# Altium footprint library Connectors_Old.PcbLib: 246 footprints (part 16 of 18)
Each footprint in its own frame and in the unit in brackets; x right, y up, seen from the top. Pads: shape width x height; smd on the part's side, far side on the other; paste and mask are expansions set on the pad; w line width, h text height; cw(c..) or ccw(c..) is an arc to the next point about the centre after c.
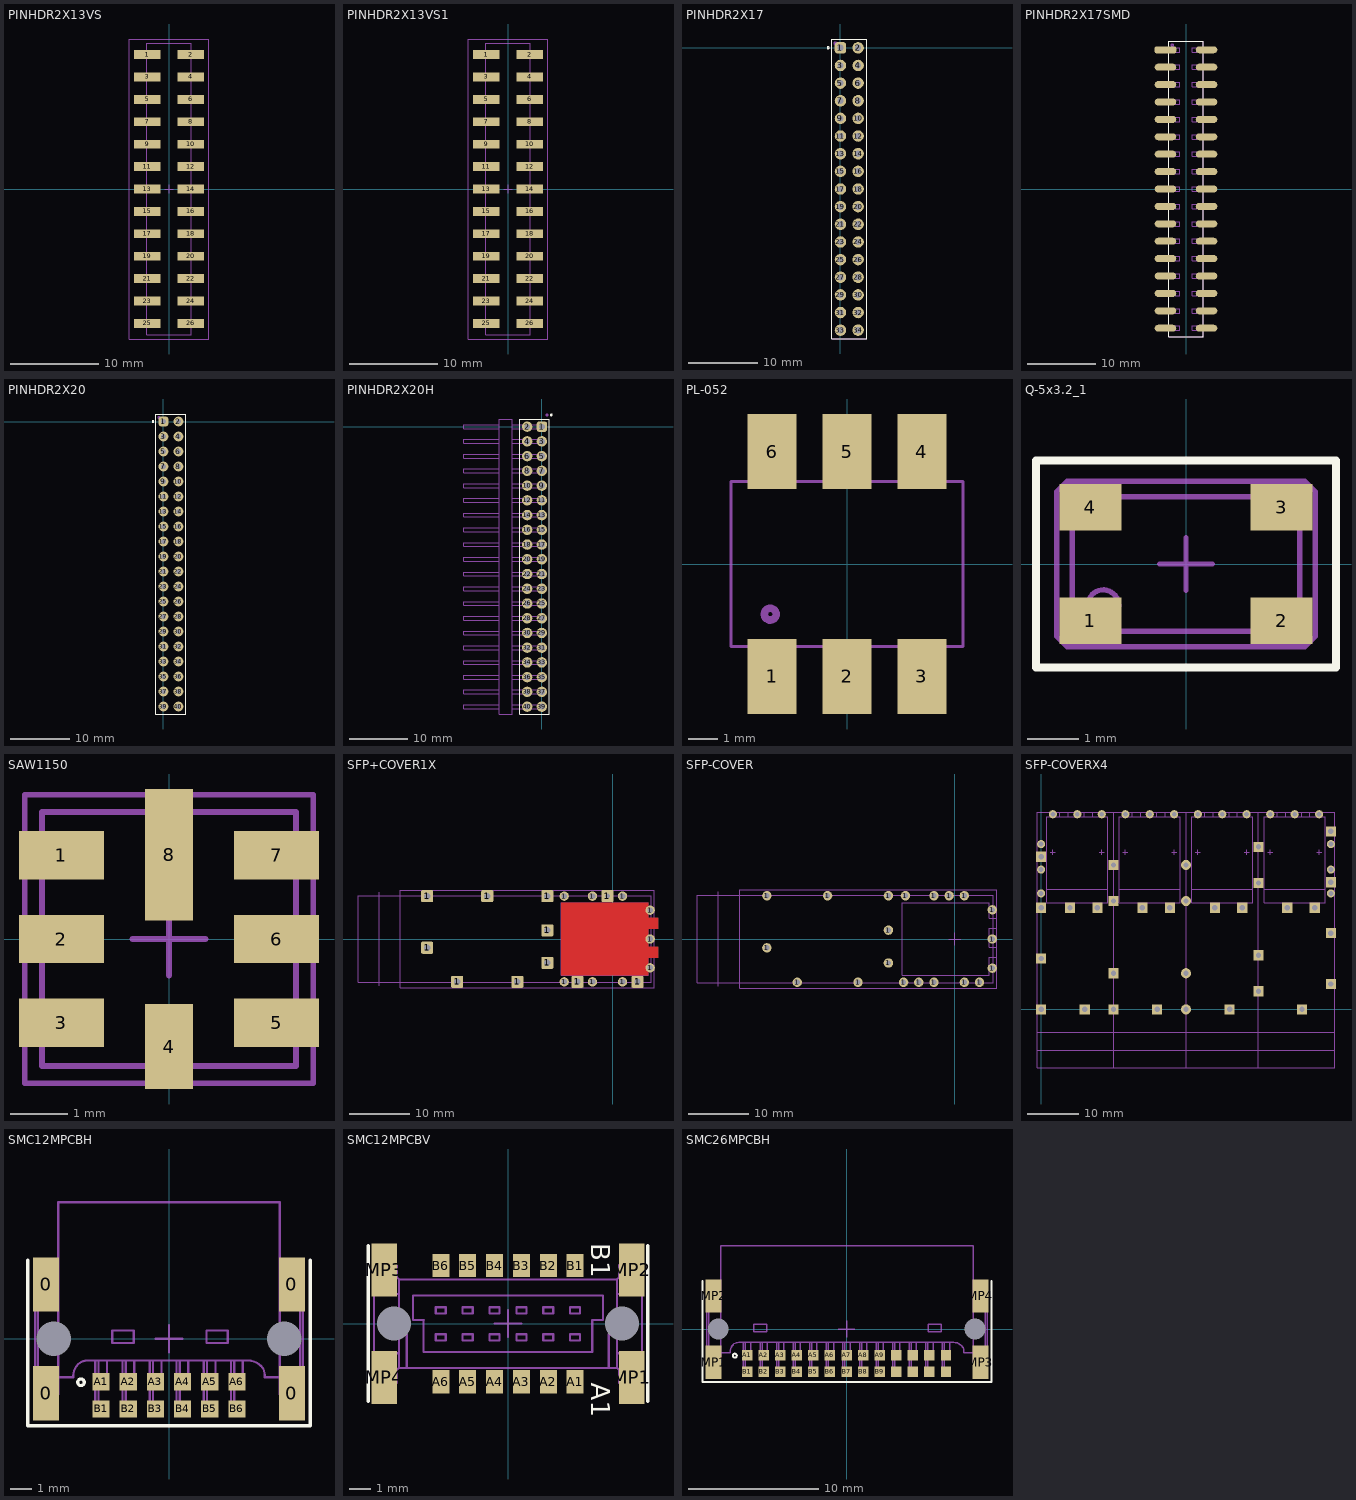
[diagram p15: the footprints below, top view; thin cyan lines are the x and y axes]

## PINHDR2X13VS [mm] "Pin header 2x13 pin R2.54mm"
height 11.04
pads (26):
  rect 3x1 smd: 1(-2.44,15.24) 2(2.44,15.24) 3(-2.44,12.7) 4(2.44,12.7) 5(-2.44,10.16) 6(2.44,10.16) 7(-2.44,7.62) 8(2.44,7.62) 9(-2.44,5.08) 10(2.44,5.08) 11(-2.44,2.54) 12(2.44,2.54) 13(-2.44,0) 14(2.44,0) 15(-2.44,-2.54) 16(2.44,-2.54) 17(-2.44,-5.08) 18(2.44,-5.08) 19(-2.44,-7.62) 20(2.44,-7.62) 21(-2.44,-10.16) 22(2.44,-10.16) 23(-2.44,-12.7) 24(2.44,-12.7) 25(-2.44,-15.24) 26(2.44,-15.24)
Mechanical 13:
  lines w0.102: -2.54,-16.51 2.54,-16.51 2.54,16.51 -2.54,16.51 -2.54,-16.51
  text "26" at 0.254,-15.85 h2.03
  text "25" at -2.134,-15.9 h2.03
  text "2" at 0.94,14.681 h2.03
  text "1" at -1.93,14.681 h2.03
Mechanical 15:
  lines w0.102: -0.5,0 0.5,0 ; 0,-0.5 0,0.5 ; -4.5,-17 -4.5,17 4.5,17 4.5,-17 -4.5,-17
3D body: height 11.04, standoff 0, extent 0.838,-15.646 1.651,-14.834
3D body: height 11.04, standoff 0, extent -1.651,-15.646 -0.838,-14.834
3D body: height 11.04, standoff 0, extent 0.838,-13.106 1.651,-12.294
3D body: height 11.04, standoff 0, extent -1.651,-13.106 -0.838,-12.294
3D body: height 11.04, standoff 0, extent 0.838,-10.566 1.651,-9.754
3D body: height 11.04, standoff 0, extent -1.651,-10.566 -0.838,-9.754
3D body: height 11.04, standoff 0, extent 0.838,-8.026 1.651,-7.214
3D body: height 11.04, standoff 0, extent -1.651,-8.026 -0.838,-7.214
3D body: height 11.04, standoff 0, extent 0.838,-5.486 1.651,-4.674
3D body: height 11.04, standoff 0, extent -1.651,-5.486 -0.838,-4.674
3D body: height 11.04, standoff 0, extent 0.838,-2.946 1.651,-2.134
3D body: height 11.04, standoff 0, extent -1.651,-2.946 -0.838,-2.134
3D body: height 11.04, standoff 0, extent 0.838,-0.406 1.651,0.406
3D body: height 11.04, standoff 0, extent -1.651,-0.406 -0.838,0.406
3D body: height 11.04, standoff 0, extent 0.838,2.134 1.651,2.946
3D body: height 11.04, standoff 0, extent -1.651,2.134 -0.838,2.946
3D body: height 11.04, standoff 0, extent 0.838,4.674 1.651,5.486
3D body: height 11.04, standoff 0, extent -1.651,4.674 -0.838,5.486
3D body: height 11.04, standoff 0, extent 0.838,7.214 1.651,8.026
3D body: height 11.04, standoff 0, extent -1.651,7.214 -0.838,8.026
3D body: height 11.04, standoff 0, extent 0.838,9.754 1.651,10.566
3D body: height 11.04, standoff 0, extent -1.651,9.754 -0.838,10.566
3D body: height 11.04, standoff 0, extent 0.838,12.294 1.651,13.106
3D body: height 11.04, standoff 0, extent -1.651,12.294 -0.838,13.106
3D body: height 11.04, standoff 0, extent 0.838,14.834 1.651,15.646
3D body: height 11.04, standoff 0, extent -1.651,14.834 -0.838,15.646
3D body: height 4.04, standoff 1.5, extent -2.54,-16.51 2.54,16.51
3D body: height 11.04, standoff 0, extent -1.651,14.834 -0.838,15.646
3D body: height 11.04, standoff 0, extent 0.838,14.834 1.651,15.646

## PINHDR2X13VS1 [mm] "Pin header 2x13 pin R2.54mm"
height 14.62
pads (26):
  rect 3x1 smd: 1(-2.44,15.24) 2(2.44,15.24) 3(-2.44,12.7) 4(2.44,12.7) 5(-2.44,10.16) 6(2.44,10.16) 7(-2.44,7.62) 8(2.44,7.62) 9(-2.44,5.08) 10(2.44,5.08) 11(-2.44,2.54) 12(2.44,2.54) 13(-2.44,0) 14(2.44,0) 15(-2.44,-2.54) 16(2.44,-2.54) 17(-2.44,-5.08) 18(2.44,-5.08) 19(-2.44,-7.62) 20(2.44,-7.62) 21(-2.44,-10.16) 22(2.44,-10.16) 23(-2.44,-12.7) 24(2.44,-12.7) 25(-2.44,-15.24) 26(2.44,-15.24)
Mechanical 13:
  lines w0.102: -2.54,-16.51 -2.54,16.51 2.54,16.51 2.54,-16.51 -2.54,-16.51
  text "1" at -1.93,14.681 h2.03
  text "2" at 0.94,14.681 h2.03
  text "25" at -2.134,-15.9 h2.03
  text "26" at 0.254,-15.85 h2.03
Mechanical 15:
  lines w0.102: -0.5,0 0.5,0 ; 0,-0.5 0,0.5 ; -4.5,-17 4.5,-17 4.5,17 -4.5,17 -4.5,-17
3D body: height 14.62, standoff 0, extent 0.838,14.834 1.651,15.646
3D body: height 14.62, standoff 0, extent -1.651,14.834 -0.838,15.646
3D body: height 4.04, standoff 1.5, extent -2.54,-16.51 2.54,16.51
3D body: height 14.62, standoff 0, extent -1.651,14.834 -0.838,15.646
3D body: height 14.62, standoff 0, extent 0.838,14.834 1.651,15.646
3D body: height 14.62, standoff 0, extent -1.651,12.294 -0.838,13.106
3D body: height 14.62, standoff 0, extent 0.838,12.294 1.651,13.106
3D body: height 14.62, standoff 0, extent -1.651,9.754 -0.838,10.566
3D body: height 14.62, standoff 0, extent 0.838,9.754 1.651,10.566
3D body: height 14.62, standoff 0, extent -1.651,7.214 -0.838,8.026
3D body: height 14.62, standoff 0, extent 0.838,7.214 1.651,8.026
3D body: height 14.62, standoff 0, extent -1.651,4.674 -0.838,5.486
3D body: height 14.62, standoff 0, extent 0.838,4.674 1.651,5.486
3D body: height 14.62, standoff 0, extent -1.651,2.134 -0.838,2.946
3D body: height 14.62, standoff 0, extent 0.838,2.134 1.651,2.946
3D body: height 14.62, standoff 0, extent -1.651,-0.406 -0.838,0.406
3D body: height 14.62, standoff 0, extent 0.838,-0.406 1.651,0.406
3D body: height 14.62, standoff 0, extent -1.651,-2.946 -0.838,-2.134
3D body: height 14.62, standoff 0, extent 0.838,-2.946 1.651,-2.134
3D body: height 14.62, standoff 0, extent -1.651,-5.486 -0.838,-4.674
3D body: height 14.62, standoff 0, extent 0.838,-5.486 1.651,-4.674
3D body: height 14.62, standoff 0, extent -1.651,-8.026 -0.838,-7.214
3D body: height 14.62, standoff 0, extent 0.838,-8.026 1.651,-7.214
3D body: height 14.62, standoff 0, extent -1.651,-10.566 -0.838,-9.754
3D body: height 14.62, standoff 0, extent 0.838,-10.566 1.651,-9.754
3D body: height 14.62, standoff 0, extent -1.651,-13.106 -0.838,-12.294
3D body: height 14.62, standoff 0, extent 0.838,-13.106 1.651,-12.294
3D body: height 14.62, standoff 0, extent -1.651,-15.646 -0.838,-14.834
3D body: height 14.62, standoff 0, extent 0.838,-15.646 1.651,-14.834

## PINHDR2X17 [mil] "Pin header 2x17 pin R2.54mm"
height 433.07
pads (34):
  rrect50% 65x65 hole 35.43 paste-50: 1(0,0)
  round 65 hole 35.43 paste-50: 2(100,0) 3(0,-100) 4(100,-100) 5(0,-200) 6(100,-200) 7(0,-300) 8(100,-300) 9(0,-400) 10(100,-400) 11(0,-500) 12(100,-500) 13(0,-600) 14(100,-600) 15(0,-700) 16(100,-700) 17(0,-800) 18(100,-800) 19(0,-900) 20(100,-900) 21(0,-1000) 22(100,-1000) 23(0,-1100) 24(100,-1100) 25(0,-1200) 26(100,-1200) 27(0,-1300) 28(100,-1300) 29(0,-1400) 30(100,-1400) 31(0,-1500) 32(100,-1500) 33(0,-1600) 34(100,-1600)
Top Overlay:
  circle w5.91: c-70,0 r6
  lines w5.91: -50,-1650 -50,50 150,50 150,-1650 -50,-1650
Mechanical 13:
  circle w10: c-29,26 r6
  lines w4: -50,-1650 -50,50 150,50 150,-1650 -50,-1650
3D body: height 314.96, standoff -125.98, extent -13,-13 13,13
3D body: height 314.96, standoff -125.98, extent 87,-13 113,13
3D body: height 100, standoff 0, extent -50,-1650 150,50
3D body: height 314.96, standoff -125.98, extent 87,-113 113,-87
3D body: height 314.96, standoff -125.98, extent -13,-113 13,-87
3D body: height 314.96, standoff -125.98, extent 87,-213 113,-187
3D body: height 314.96, standoff -125.98, extent -13,-213 13,-187
3D body: height 314.96, standoff -125.98, extent 87,-313 113,-287
3D body: height 314.96, standoff -125.98, extent -13,-313 13,-287
3D body: height 314.96, standoff -125.98, extent 87,-413 113,-387
3D body: height 314.96, standoff -125.98, extent -13,-413 13,-387
3D body: height 314.96, standoff -125.98, extent 87,-513 113,-487
3D body: height 314.96, standoff -125.98, extent -13,-513 13,-487
3D body: height 314.96, standoff -125.98, extent 87,-613 113,-587
3D body: height 314.96, standoff -125.98, extent -13,-613 13,-587
3D body: height 314.96, standoff -125.98, extent 87,-713 113,-687
3D body: height 314.96, standoff -125.98, extent -13,-713 13,-687
3D body: height 314.96, standoff -125.98, extent 87,-813 113,-787
3D body: height 314.96, standoff -125.98, extent -13,-813 13,-787
3D body: height 314.96, standoff -125.98, extent 87,-913 113,-887
3D body: height 314.96, standoff -125.98, extent -13,-913 13,-887
3D body: height 314.96, standoff -125.98, extent 87,-1013 113,-987
3D body: height 314.96, standoff -125.98, extent -13,-1013 13,-987
3D body: height 314.96, standoff -125.98, extent 87,-1113 113,-1087
3D body: height 314.96, standoff -125.98, extent -13,-1113 13,-1087
3D body: height 314.96, standoff -125.98, extent 87,-1213 113,-1187
3D body: height 314.96, standoff -125.98, extent -13,-1213 13,-1187
3D body: height 314.96, standoff -125.98, extent 87,-1313 113,-1287
3D body: height 314.96, standoff -125.98, extent -13,-1313 13,-1287
3D body: height 314.96, standoff -125.98, extent 87,-1413 113,-1387
3D body: height 314.96, standoff -125.98, extent -13,-1413 13,-1387
3D body: height 314.96, standoff -125.98, extent 87,-1513 113,-1487
3D body: height 314.96, standoff -125.98, extent -13,-1513 13,-1487
3D body: height 314.96, standoff -125.98, extent 87,-1613 113,-1587
3D body: height 314.96, standoff -125.98, extent -13,-1613 13,-1587

## PINHDR2X17SMD [mil] "Pin header 2x17 pin R2.54mm SMD"
height 433.07
pads (34):
  rrect50% 124x40 smd: 1(-118,800)
  oval 124x40 smd: 2(118,800) 3(-118,700) 4(118,700) 5(-118,600) 6(118,600) 7(-118,500) 8(118,500) 9(-118,400) 10(118,400) 11(-118,300) 12(118,300) 13(-118,200) 14(118,200) 15(-118,100) 16(118,100) 17(-118,0) 18(118,0) 19(-118,-100) 20(118,-100) 21(-118,-200) 22(118,-200) 23(-118,-300) 24(118,-300) 25(-118,-400) 26(118,-400) 27(-118,-500) 28(118,-500) 29(-118,-600) 30(118,-600) 31(-118,-700) 32(118,-700) 33(-118,-800) 34(118,-800)
Top Overlay:
  lines w5.91: -100,-850 100,-850 100,850 -100,850 -100,-850
Mechanical 13:
  circle w10: c-79,826 r6
  lines w3.94: -63,-813 -37,-813 -37,-787 -63,-787 -63,-813 ; -63,-713 -63,-687 -37,-687 -37,-713 -63,-713 ; -63,-613 -37,-613 -37,-587 -63,-587 -63,-613 ; -63,-513 -63,-487 -37,-487 -37,-513 -63,-513 ; -63,-413 -37,-413 -37,-387 -63,-387 -63,-413 ; -63,-313 -63,-287 -37,-287 -37,-313 -63,-313 ; -63,-213 -37,-213 -37,-187 -63,-187 -63,-213 ; -63,-113 -63,-87 -37,-87 -37,-113 -63,-113 ; -63,-13 -37,-13 -37,13 -63,13 -63,-13 ; -63,87 -63,113 -37,113 -37,87 -63,87 ; -63,187 -37,187 -37,213 -63,213 -63,187 ; -63,287 -63,313 -37,313 -37,287 -63,287 ; -63,387 -37,387 -37,413 -63,413 -63,387 ; -63,487 -63,513 -37,513 -37,487 -63,487 ; -63,587 -37,587 -37,613 -63,613 -63,587 ; -63,687 -37,687 -37,713 -63,713 -63,687 ; -63,787 -63,813 -37,813 -37,787 -63,787 ; 37,-813 37,-787 63,-787 63,-813 37,-813 ; 37,-713 63,-713 63,-687 37,-687 37,-713 ; 37,-613 37,-587 63,-587 63,-613 37,-613 ; 37,-513 63,-513 63,-487 37,-487 37,-513 ; 37,-413 37,-387 63,-387 63,-413 37,-413 ; 37,-313 63,-313 63,-287 37,-287 37,-313 ; 37,-213 37,-187 63,-187 63,-213 37,-213 ; 37,-113 63,-113 63,-87 37,-87 37,-113 ; 37,-13 37,13 63,13 63,-13 37,-13 ; 37,87 63,87 63,113 37,113 37,87 ; 37,187 37,213 63,213 63,187 37,187 ; 37,287 63,287 63,313 37,313 37,287 ; 37,387 37,413 63,413 63,387 37,387 ; 37,487 63,487 63,513 37,513 37,487 ; 37,587 37,613 63,613 63,587 37,587 ; 37,687 37,713 63,713 63,687 37,687 ; 37,787 63,787 63,813 37,813 37,787
  lines w4: -100,-850 100,-850 100,850 -100,850 -100,-850
3D body: height 100, standoff 0, extent -100,-850 100,850
3D body: height 393.7, standoff 0, extent -63,787 -37,813
3D body: height 393.7, standoff 0, extent 37,787 63,813
3D body: height 393.7, standoff 0, extent 37,687 63,713
3D body: height 393.7, standoff 0, extent -63,687 -37,713
3D body: height 393.7, standoff 0, extent -63,487 -37,513
3D body: height 393.7, standoff 0, extent 37,487 63,513
3D body: height 393.7, standoff 0, extent 37,587 63,613
3D body: height 393.7, standoff 0, extent -63,587 -37,613
3D body: height 393.7, standoff 0, extent -63,287 -37,313
3D body: height 393.7, standoff 0, extent 37,287 63,313
3D body: height 393.7, standoff 0, extent 37,387 63,413
3D body: height 393.7, standoff 0, extent -63,387 -37,413
3D body: height 393.7, standoff 0, extent -63,87 -37,113
3D body: height 393.7, standoff 0, extent 37,87 63,113
3D body: height 393.7, standoff 0, extent 37,187 63,213
3D body: height 393.7, standoff 0, extent -63,187 -37,213
3D body: height 393.7, standoff 0, extent -63,-113 -37,-87
3D body: height 393.7, standoff 0, extent 37,-113 63,-87
3D body: height 393.7, standoff 0, extent 37,-13 63,13
3D body: height 393.7, standoff 0, extent -63,-13 -37,13
3D body: height 393.7, standoff 0, extent -63,-313 -37,-287
3D body: height 393.7, standoff 0, extent 37,-313 63,-287
3D body: height 393.7, standoff 0, extent 37,-213 63,-187
3D body: height 393.7, standoff 0, extent -63,-213 -37,-187
3D body: height 393.7, standoff 0, extent -63,-513 -37,-487
3D body: height 393.7, standoff 0, extent 37,-513 63,-487
3D body: height 393.7, standoff 0, extent 37,-413 63,-387
3D body: height 393.7, standoff 0, extent -63,-413 -37,-387
3D body: height 393.7, standoff 0, extent -63,-713 -37,-687
3D body: height 393.7, standoff 0, extent 37,-713 63,-687
3D body: height 393.7, standoff 0, extent 37,-613 63,-587
3D body: height 393.7, standoff 0, extent -63,-613 -37,-587
3D body: height 393.7, standoff 0, extent 37,-813 63,-787
3D body: height 393.7, standoff 0, extent -63,-813 -37,-787

## PINHDR2X20 [mil] "Pin header 2x20 pin R2.54mm"
height 433.07
pads (40):
  rrect50% 65x65 hole 35.43 paste-50: 1(0,0)
  round 65 hole 35.43 paste-50: 2(100,0) 3(0,-100) 4(100,-100) 5(0,-200) 6(100,-200) 7(0,-300) 8(100,-300) 9(0,-400) 10(100,-400) 11(0,-500) 12(100,-500) 13(0,-600) 14(100,-600) 15(0,-700) 16(100,-700) 17(0,-800) 18(100,-800) 19(0,-900) 20(100,-900) 21(0,-1000) 22(100,-1000) 23(0,-1100) 24(100,-1100) 25(0,-1200) 26(100,-1200) 27(0,-1300) 28(100,-1300) 29(0,-1400) 30(100,-1400) 31(0,-1500) 32(100,-1500) 33(0,-1600) 34(100,-1600) 35(0,-1700) 36(100,-1700) 37(0,-1800) 38(100,-1800) 39(0,-1900) 40(100,-1900)
Top Overlay:
  circle w5.91: c-70,0 r6
  lines w5.91: -50,-1950 150,-1950 150,50 -50,50 -50,-1950
Mechanical 13:
  drawing of 165 lines, arcs and shapes, not listed
3D body: height 314.96, standoff -125.98, extent 87,-1913 113,-1887
3D body: height 314.96, standoff -125.98, extent -13,-1913 13,-1887
3D body: height 314.96, standoff -125.98, extent -13,-1813 13,-1787
3D body: height 314.96, standoff -125.98, extent 87,-1813 113,-1787
3D body: height 314.96, standoff -125.98, extent -13,-1713 13,-1687
3D body: height 314.96, standoff -125.98, extent 87,-1713 113,-1687
3D body: height 314.96, standoff -125.98, extent -13,-1613 13,-1587
3D body: height 314.96, standoff -125.98, extent 87,-1613 113,-1587
3D body: height 314.96, standoff -125.98, extent -13,-1513 13,-1487
3D body: height 314.96, standoff -125.98, extent 87,-1513 113,-1487
3D body: height 314.96, standoff -125.98, extent -13,-1413 13,-1387
3D body: height 314.96, standoff -125.98, extent 87,-1413 113,-1387
3D body: height 314.96, standoff -125.98, extent -13,-1313 13,-1287
3D body: height 314.96, standoff -125.98, extent 87,-1313 113,-1287
3D body: height 314.96, standoff -125.98, extent -13,-1213 13,-1187
3D body: height 314.96, standoff -125.98, extent 87,-1213 113,-1187
3D body: height 314.96, standoff -125.98, extent -13,-1113 13,-1087
3D body: height 314.96, standoff -125.98, extent 87,-1113 113,-1087
3D body: height 314.96, standoff -125.98, extent -13,-1013 13,-987
3D body: height 314.96, standoff -125.98, extent 87,-1013 113,-987
3D body: height 314.96, standoff -125.98, extent -13,-913 13,-887
3D body: height 314.96, standoff -125.98, extent 87,-913 113,-887
3D body: height 314.96, standoff -125.98, extent -13,-813 13,-787
3D body: height 314.96, standoff -125.98, extent 87,-813 113,-787
3D body: height 314.96, standoff -125.98, extent -13,-713 13,-687
3D body: height 314.96, standoff -125.98, extent 87,-713 113,-687
3D body: height 314.96, standoff -125.98, extent -13,-613 13,-587
3D body: height 314.96, standoff -125.98, extent 87,-613 113,-587
3D body: height 314.96, standoff -125.98, extent -13,-513 13,-487
3D body: height 314.96, standoff -125.98, extent 87,-513 113,-487
3D body: height 314.96, standoff -125.98, extent -13,-413 13,-387
3D body: height 314.96, standoff -125.98, extent 87,-413 113,-387
3D body: height 314.96, standoff -125.98, extent -13,-313 13,-287
3D body: height 314.96, standoff -125.98, extent 87,-313 113,-287
3D body: height 314.96, standoff -125.98, extent -13,-213 13,-187
3D body: height 314.96, standoff -125.98, extent 87,-213 113,-187
3D body: height 314.96, standoff -125.98, extent -13,-113 13,-87
3D body: height 314.96, standoff -125.98, extent 87,-113 113,-87
3D body: height 100, standoff 0, extent -50,-1950 150,50
3D body: height 314.96, standoff -125.98, extent 87,-13 113,13
3D body: height 314.96, standoff -125.98, extent -13,-13 13,13

## PINHDR2X20H [mm] "Pin header 2x20 pin R2.54mm Horizontal"
height 8.16
pads (40):
  rrect50% 1.8x1.8 hole 1 paste-1.27: 1(0,0)
  round 1.8 hole 1 paste-1.27: 2(-2.54,0) 3(0,-2.54) 4(-2.54,-2.54) 5(0,-5.08) 6(-2.54,-5.08) 7(0,-7.62) 8(-2.54,-7.62) 9(0,-10.16) 10(-2.54,-10.16) 11(0,-12.7) 12(-2.54,-12.7) 13(0,-15.24) 14(-2.54,-15.24) 15(0,-17.78) 16(-2.54,-17.78) 17(0,-20.32) 18(-2.54,-20.32) 19(0,-22.86) 20(-2.54,-22.86) 21(0,-25.4) 22(-2.54,-25.4) 23(0,-27.94) 24(-2.54,-27.94) 25(0,-30.48) 26(-2.54,-30.48) 27(0,-33.02) 28(-2.54,-33.02) 29(0,-35.56) 30(-2.54,-35.56) 31(0,-38.1) 32(-2.54,-38.1) 33(0,-40.64) 34(-2.54,-40.64) 35(0,-43.18) 36(-2.54,-43.18) 37(0,-45.72) 38(-2.54,-45.72) 39(0,-48.26) 40(-2.54,-48.26)
Top Overlay:
  circle w0.15: c1.626,2.032 r0.152
  lines w0.15: -3.81,-49.53 1.27,-49.53 1.27,1.27 -3.81,1.27 -3.81,-49.53
Mechanical 13:
  circle w0.254: c0.864,2.032 r0.152
  lines w0.1: -7.37,-48.59 -13.462,-48.59 -13.462,-47.93 -7.37,-47.93 ; -7.37,-46.05 -13.462,-46.05 -13.462,-45.39 -7.37,-45.39 ; -7.37,-43.51 -13.462,-43.51 -13.462,-42.85 -7.37,-42.85 ; -7.37,-40.97 -13.462,-40.97 -13.462,-40.31 -7.37,-40.31 ; -7.37,-38.43 -13.462,-38.43 -13.462,-37.77 -7.37,-37.77 ; -7.37,-35.89 -13.462,-35.89 -13.462,-35.23 -7.37,-35.23 ; -7.37,-33.35 -13.462,-33.35 -13.462,-32.69 -7.37,-32.69 ; -7.37,-30.81 -13.462,-30.81 -13.462,-30.15 -7.37,-30.15 ; -7.37,-28.27 -13.462,-28.27 -13.462,-27.61 -7.37,-27.61 ; -7.37,-25.73 -13.462,-25.73 -13.462,-25.07 -7.37,-25.07 ; -7.37,-23.19 -13.462,-23.19 -13.462,-22.53 -7.37,-22.53 ; -7.37,-20.65 -13.462,-20.65 -13.462,-19.99 -7.37,-19.99 ; -7.37,-18.11 -13.462,-18.11 -13.462,-17.45 -7.37,-17.45 ; -7.37,-15.57 -13.462,-15.57 -13.462,-14.91 -7.37,-14.91 ; -7.37,-13.03 -13.462,-13.03 -13.462,-12.37 -7.37,-12.37 ; -7.37,-10.49 -13.462,-10.49 -13.462,-9.83 -7.37,-9.83 ; -7.37,-7.95 -13.462,-7.95 -13.462,-7.29 -7.37,-7.29 ; -7.37,-5.41 -13.462,-5.41 -13.462,-4.75 -7.37,-4.75 ; -7.37,-2.87 -13.462,-2.87 -13.462,-2.21 -7.37,-2.21 ; -7.37,-0.33 -13.462,-0.33 -13.462,0.33 -7.37,0.33 ; -5.08,-48.59 0.33,-48.59 0.33,-47.93 -5.08,-47.93 ; -5.08,-46.05 0.33,-46.05 0.33,-45.39 -5.08,-45.39 ; -5.08,-43.51 0.33,-43.51 0.33,-42.85 -5.08,-42.85 ; -5.08,-40.97 0.33,-40.97 0.33,-40.31 -5.08,-40.31 ; -5.08,-38.43 0.33,-38.43 0.33,-37.77 -5.08,-37.77 ; -5.08,-35.89 0.33,-35.89 0.33,-35.23 -5.08,-35.23 ; -5.08,-33.35 0.33,-33.35 0.33,-32.69 -5.08,-32.69 ; -5.08,-30.81 0.33,-30.81 0.33,-30.15 -5.08,-30.15 ; -5.08,-28.27 0.33,-28.27 0.33,-27.61 -5.08,-27.61 ; -5.08,-25.73 0.33,-25.73 0.33,-25.07 -5.08,-25.07 ; -5.08,-23.19 0.33,-23.19 0.33,-22.53 -5.08,-22.53 ; -5.08,-20.65 0.33,-20.65 0.33,-19.99 -5.08,-19.99 ; -5.08,-18.11 0.33,-18.11 0.33,-17.45 -5.08,-17.45 ; -5.08,-15.57 0.33,-15.57 0.33,-14.91 -5.08,-14.91 ; -5.08,-13.03 0.33,-13.03 0.33,-12.37 -5.08,-12.37 ; -5.08,-10.49 0.33,-10.49 0.33,-9.83 -5.08,-9.83 ; -5.08,-7.95 0.33,-7.95 0.33,-7.29 -5.08,-7.29 ; -5.08,-5.41 0.33,-5.41 0.33,-4.75 -5.08,-4.75 ; -5.08,-2.87 0.33,-2.87 0.33,-2.21 -5.08,-2.21 ; -5.08,-0.33 0.33,-0.33 0.33,0.33 -5.08,0.33
  lines w0.102: -7.37,-49.53 -7.37,1.27 -5.08,1.27 -5.08,-49.53 -7.37,-49.53
3D body: height 3.75, standoff 0, extent -0.33,-0.33 0.33,0.33
3D body: height 3.75, standoff 0, extent -0.33,-2.87 0.33,-2.21
3D body: height 3.75, standoff 0, extent -0.33,-5.41 0.33,-4.75
3D body: height 3.75, standoff 0, extent -0.33,-7.95 0.33,-7.29
3D body: height 3.75, standoff 0, extent -0.33,-10.49 0.33,-9.83
3D body: height 3.75, standoff 0, extent -0.33,-13.03 0.33,-12.37
3D body: height 3.75, standoff 0, extent -0.33,-15.57 0.33,-14.91
3D body: height 3.75, standoff 0, extent -0.33,-18.11 0.33,-17.45
3D body: height 3.75, standoff 0, extent -0.33,-20.65 0.33,-19.99
3D body: height 3.75, standoff 0, extent -0.33,-23.19 0.33,-22.53
3D body: height 3.75, standoff 0, extent -0.33,-25.73 0.33,-25.07
3D body: height 3.75, standoff 0, extent -0.33,-28.27 0.33,-27.61
3D body: height 3.75, standoff 0, extent -0.33,-30.81 0.33,-30.15
3D body: height 3.75, standoff 0, extent -0.33,-33.35 0.33,-32.69
3D body: height 3.75, standoff 0, extent -0.33,-35.89 0.33,-35.23
3D body: height 3.75, standoff 0, extent -0.33,-38.43 0.33,-37.77
3D body: height 3.75, standoff 0, extent -0.33,-40.97 0.33,-40.31
3D body: height 3.75, standoff 0, extent -0.33,-43.51 0.33,-42.85
3D body: height 3.75, standoff 0, extent -0.33,-46.05 0.33,-45.39
3D body: height 3.75, standoff 0, extent -0.33,-48.59 0.33,-47.93
3D body: height 1.25, standoff 0, extent -2.87,-0.33 -2.21,0.33
3D body: height 1.25, standoff 0, extent -2.87,-2.87 -2.21,-2.21
3D body: height 1.25, standoff 0, extent -2.87,-5.41 -2.21,-4.75
3D body: height 1.25, standoff 0, extent -2.87,-7.95 -2.21,-7.29
3D body: height 1.25, standoff 0, extent -2.87,-10.49 -2.21,-9.83
3D body: height 1.25, standoff 0, extent -2.87,-13.03 -2.21,-12.37
3D body: height 1.25, standoff 0, extent -2.87,-15.57 -2.21,-14.91
3D body: height 1.25, standoff 0, extent -2.87,-18.11 -2.21,-17.45
3D body: height 1.25, standoff 0, extent -2.87,-20.65 -2.21,-19.99
3D body: height 1.25, standoff 0, extent -2.87,-23.19 -2.21,-22.53
3D body: height 1.25, standoff 0, extent -2.87,-25.73 -2.21,-25.07
3D body: height 1.25, standoff 0, extent -2.87,-28.27 -2.21,-27.61
3D body: height 1.25, standoff 0, extent -2.87,-30.81 -2.21,-30.15
3D body: height 1.25, standoff 0, extent -2.87,-33.35 -2.21,-32.69
3D body: height 1.25, standoff 0, extent -2.87,-35.89 -2.21,-35.23
3D body: height 1.25, standoff 0, extent -2.87,-38.43 -2.21,-37.77
3D body: height 1.25, standoff 0, extent -2.87,-40.97 -2.21,-40.31
3D body: height 1.25, standoff 0, extent -2.87,-43.51 -2.21,-42.85
3D body: height 1.25, standoff 0, extent -2.87,-46.05 -2.21,-45.39
3D body: height 1.25, standoff 0, extent -2.87,-48.59 -2.21,-47.93
3D body: height 5, standoff 0, extent -7.37,-49.53 -5.08,1.27
3D body: height 1.9, standoff 1.25, extent -5.08,-48.59 -2.21,-47.93
3D body: height 1.9, standoff 1.25, extent -5.08,-46.05 -2.21,-45.39
3D body: height 1.9, standoff 1.25, extent -5.08,-43.51 -2.21,-42.85
3D body: height 1.9, standoff 1.25, extent -5.08,-40.97 -2.21,-40.31
3D body: height 1.9, standoff 1.25, extent -5.08,-38.43 -2.21,-37.77
3D body: height 1.9, standoff 1.25, extent -5.08,-35.89 -2.21,-35.23
3D body: height 1.9, standoff 1.25, extent -5.08,-33.35 -2.21,-32.69
3D body: height 1.9, standoff 1.25, extent -5.08,-30.81 -2.21,-30.15
3D body: height 1.9, standoff 1.25, extent -5.08,-28.27 -2.21,-27.61
3D body: height 1.9, standoff 1.25, extent -5.08,-25.73 -2.21,-25.07
3D body: height 1.9, standoff 1.25, extent -5.08,-23.19 -2.21,-22.53
3D body: height 1.9, standoff 1.25, extent -5.08,-20.65 -2.21,-19.99
3D body: height 1.9, standoff 1.25, extent -5.08,-18.11 -2.21,-17.45
3D body: height 1.9, standoff 1.25, extent -5.08,-15.57 -2.21,-14.91
3D body: height 1.9, standoff 1.25, extent -5.08,-13.03 -2.21,-12.37
3D body: height 1.9, standoff 1.25, extent -5.08,-10.49 -2.21,-9.83
3D body: height 1.9, standoff 1.25, extent -5.08,-7.95 -2.21,-7.29
3D body: height 1.9, standoff 1.25, extent -5.08,-5.41 -2.21,-4.75
3D body: height 1.9, standoff 1.25, extent -5.08,-2.87 -2.21,-2.21
3D body: height 1.9, standoff 1.25, extent -5.08,-0.33 -2.21,0.33
3D body: height 4.43, standoff 3.75, extent -5.08,-48.59 0.33,-47.93
3D body: height 4.43, standoff 3.75, extent -5.08,-46.05 0.33,-45.39
3D body: height 4.43, standoff 3.75, extent -5.08,-43.51 0.33,-42.85
3D body: height 4.43, standoff 3.75, extent -5.08,-40.97 0.33,-40.31
3D body: height 4.43, standoff 3.75, extent -5.08,-38.43 0.33,-37.77
3D body: height 4.43, standoff 3.75, extent -5.08,-35.89 0.33,-35.23
3D body: height 4.43, standoff 3.75, extent -5.08,-33.35 0.33,-32.69
3D body: height 4.43, standoff 3.75, extent -5.08,-30.81 0.33,-30.15
3D body: height 4.43, standoff 3.75, extent -5.08,-28.27 0.33,-27.61
3D body: height 4.43, standoff 3.75, extent -5.08,-25.73 0.33,-25.07
3D body: height 4.43, standoff 3.75, extent -5.08,-23.19 0.33,-22.53
3D body: height 4.43, standoff 3.75, extent -5.08,-20.65 0.33,-19.99
3D body: height 4.43, standoff 3.75, extent -5.08,-18.11 0.33,-17.45
3D body: height 4.43, standoff 3.75, extent -5.08,-15.57 0.33,-14.91
3D body: height 4.43, standoff 3.75, extent -5.08,-13.03 0.33,-12.37
3D body: height 4.43, standoff 3.75, extent -5.08,-10.49 0.33,-9.83
3D body: height 4.43, standoff 3.75, extent -5.08,-7.95 0.33,-7.29
3D body: height 4.43, standoff 3.75, extent -5.08,-5.41 0.33,-4.75
3D body: height 4.43, standoff 3.75, extent -5.08,-2.87 0.33,-2.21
3D body: height 4.43, standoff 3.75, extent -5.08,-0.33 0.33,0.33
3D body: height 4.43, standoff 3.75, extent -13.462,-48.59 -7.37,-47.93
3D body: height 4.43, standoff 3.75, extent -13.462,-46.05 -7.37,-45.39
3D body: height 4.43, standoff 3.75, extent -13.462,-43.51 -7.37,-42.85
3D body: height 4.43, standoff 3.75, extent -13.462,-40.97 -7.37,-40.31
3D body: height 4.43, standoff 3.75, extent -13.462,-38.43 -7.37,-37.77
3D body: height 4.43, standoff 3.75, extent -13.462,-35.89 -7.37,-35.23
3D body: height 4.43, standoff 3.75, extent -13.462,-33.35 -7.37,-32.69
3D body: height 4.43, standoff 3.75, extent -13.462,-30.81 -7.37,-30.15
3D body: height 4.43, standoff 3.75, extent -13.462,-28.27 -7.37,-27.61
3D body: height 4.43, standoff 3.75, extent -13.462,-25.73 -7.37,-25.07
3D body: height 4.43, standoff 3.75, extent -13.462,-23.19 -7.37,-22.53
3D body: height 4.43, standoff 3.75, extent -13.462,-20.65 -7.37,-19.99
3D body: height 4.43, standoff 3.75, extent -13.462,-18.11 -7.37,-17.45
3D body: height 4.43, standoff 3.75, extent -13.462,-15.57 -7.37,-14.91
3D body: height 4.43, standoff 3.75, extent -13.462,-13.03 -7.37,-12.37
3D body: height 4.43, standoff 3.75, extent -13.462,-10.49 -7.37,-9.83
3D body: height 4.43, standoff 3.75, extent -13.462,-7.95 -7.37,-7.29
3D body: height 4.43, standoff 3.75, extent -13.462,-5.41 -7.37,-4.75
3D body: height 4.43, standoff 3.75, extent -13.462,-2.87 -7.37,-2.21
3D body: height 4.43, standoff 3.75, extent -13.462,-0.33 -7.37,0.33
3D body: height 1.9, standoff 1.25, extent -13.462,-48.59 -7.37,-47.93
3D body: height 1.9, standoff 1.25, extent -13.462,-46.05 -7.37,-45.39
3D body: height 1.9, standoff 1.25, extent -13.462,-43.51 -7.37,-42.85
3D body: height 1.9, standoff 1.25, extent -13.462,-40.97 -7.37,-40.31
3D body: height 1.9, standoff 1.25, extent -13.462,-38.43 -7.37,-37.77
3D body: height 1.9, standoff 1.25, extent -13.462,-35.89 -7.37,-35.23
3D body: height 1.9, standoff 1.25, extent -13.462,-33.35 -7.37,-32.69
3D body: height 1.9, standoff 1.25, extent -13.462,-30.81 -7.37,-30.15
3D body: height 1.9, standoff 1.25, extent -13.462,-28.27 -7.37,-27.61
3D body: height 1.9, standoff 1.25, extent -13.462,-25.73 -7.37,-25.07
3D body: height 1.9, standoff 1.25, extent -13.462,-23.19 -7.37,-22.53
3D body: height 1.9, standoff 1.25, extent -13.462,-20.65 -7.37,-19.99
3D body: height 1.9, standoff 1.25, extent -13.462,-18.11 -7.37,-17.45
3D body: height 1.9, standoff 1.25, extent -13.462,-15.57 -7.37,-14.91
3D body: height 1.9, standoff 1.25, extent -13.462,-13.03 -7.37,-12.37
3D body: height 1.9, standoff 1.25, extent -13.462,-10.49 -7.37,-9.83
3D body: height 1.9, standoff 1.25, extent -13.462,-7.95 -7.37,-7.29
3D body: height 1.9, standoff 1.25, extent -13.462,-5.41 -7.37,-4.75
3D body: height 1.9, standoff 1.25, extent -13.462,-2.87 -7.37,-2.21
3D body: height 1.9, standoff 1.25, extent -13.462,-0.33 -7.37,0.33

## PL-052 [mm] "RF Mixer"
height 2.84
pads (6):
  rect 1.65x2.54 smd: 1(-2.54,-3.81) 2(0,-3.81) 3(2.54,-3.81) 4(2.54,3.81) 5(0,3.81) 6(-2.54,3.81)
Mechanical 13:
  circle w0.254: c-2.6,-1.7 r0.2
  lines w0.102: -3.935,-2.795 3.935,-2.795 3.935,2.795 -3.935,2.795 -3.935,-2.795
3D body: height 2.84, standoff 0, extent -3.935,-2.795 3.935,2.795
3D body: height 2.85, standoff 2.84, extent -3.1,-2.2 -2.104,-1.202

## Q-5x3.2_1 [mm] "Quartz crystal 5x3.2x1.05mm"
height 1.05
pads (4):
  rect 1.2x0.9 smd: 1(-1.85,-1.1) 2(1.85,-1.1) 3(1.85,1.1) 4(-1.85,1.1)
Top Overlay:
  lines w0.15: -2.9,-2 2.9,-2 2.9,2 -2.9,2 -2.9,-2
Mechanical 13:
  circle w0.102: c-1.6,-0.8 r0.3
  lines w0.102: -2.5,-1.4 -2.5,1.4 -2.3,1.6 2.3,1.6 2.5,1.4 2.5,-1.4 2.3,-1.6 -2.3,-1.6 -2.5,-1.4 ; -2.2,-1.3 -2.2,1.3 2.2,1.3 2.2,-1.3 -2.2,-1.3
Mechanical 15:
  lines w0.102: -0.508,0 0.508,0 ; 0,-0.508 0,0.508
3D body: height 0.4, standoff 0, extent -2.5,-1.6 2.5,1.6
3D body: height 1.05, standoff 0.4, extent -2.2,-1.3 2.2,1.3
3D body: height 0.81, standoff 0.8, extent -2.005,-1.03 -1.495,-0.52
3D body: height 1.06, standoff 1.05, extent -1.906,-1.106 -1.294,-0.494

## RFTRF-KK81 [mm]
height 6.6

## SAW1150 [mm] "SAW filter 8 pin 5MM; R1.27mm"
height 1
pads (8):
  rect 1.47x0.84 smd: 1(-1.865,1.45) 2(-1.865,0) 3(-1.865,-1.45) 5(1.865,-1.45) 6(1.865,0) 7(1.865,1.45)
  rect 0.84x1.47 smd: 4(0,-1.865)
  rect 0.84x2.28 smd: 8(0,1.46)
Mechanical 13:
  lines w0.102: -2.5,-2.5 -2.5,2.5 2.5,2.5 2.5,-2.5 -2.5,-2.5
Mechanical 15:
  lines w0.102: -0.635,0 0.635,0 ; 0,-0.635 0,0.635 ; -2.2,-2.2 2.2,-2.2 2.2,2.2 -2.2,2.2 -2.2,-2.2
3D body: height 1.71, standoff 1.7, extent -1.798,1.201 -1.2,1.799
3D body: height 1.7, standoff 1.5, extent -2.21,-2.21 2.21,2.21
3D body: height 1.5, standoff 0, extent -2.5,-2.5 2.5,2.5

## SFP+COVER1X [mm] "SFP+ Cage Tyco 2007198-1"
height 10.4
pads (20):
  rrect20% 2x2 hole 1.05: 1(-30.9,-1.455) 1(-30.9,7.125) 1(-25.9,-7.125) 1(-20.9,7.125) 1(-15.9,-7.125) 1(-10.9,-3.955) 1(-10.9,1.445) 1(-10.9,7.125) 1(-5.9,-7.125) 1(4.1,-7.125)
  round 1.55 hole 0.95: 1(-8.1,-7.125) 1(-8.1,7.125) 1(-3.4,-7.125) 1(-3.4,7.125) 1(1.6,-7.125) 1(1.6,7.125) 1(6.2,-4.8) 1(6.2,0) 1(6.2,4.8)
  rrect20% 2x2 hole 0.85: 1(-0.9,7.125)
Top Layer:
  pour cut-out: 7.5,3.5 7.5,1.7 5.9,1.7 5.9,-1.3 7.5,-1.3 7.5,-3.1 5.9,-3.1 5.9,-6 -8.6,-6 -8.6,6 5.9,6 5.9,3.5
Mechanical 13:
  lines w0.102: -42.4,-7.2 6.35,-7.2 6.35,7.2 -42.4,7.2 -42.4,-7.2
Mechanical 15:
  lines w0.102: -38.9,-7.8 -38.9,7.8 ; -1,0 1,0 ; 0,-1 0,1 ; 6.9,-3 5.9,-3 5.9,-6 -8.6,-6 -8.6,3.8 -8.6,6 5.9,6 5.9,3.45 6.9,3.45 ; 6.9,-1.35 5.9,-1.35 5.9,1.75 6.9,1.75 ; -35.4,-8.1 -35.4,-7.2 -35.4,7.2 -35.4,8.1 6.9,8.1 6.9,-8.1 -35.4,-8.1
  text "CNSFP20" at -1,-4.3 h1.3
  text "center for" at -2.7,-6 h1.3
  text "PPL" at -37.2,-1.5 h1.4
  text "PCB" at -33.5,-1.9 h1.4
  text "GND only" at -18.1,-5.1 h1.3
3D body: height 10.47, standoff -2.98, extent -42.4,-8.008 6.4,8.008

## SFP-COVER [mm]
pads (20):
  round 1.55 hole 0.85: 1(-30.9,-1.45) 1(-30.9,7.125) 1(-25.9,-7.125) 1(-20.9,7.125) 1(-15.9,-7.125) 1(-10.9,-3.95) 1(-10.9,1.45) 1(-10.9,7.125) 1(-8.4,-7.125) 1(-8.1,7.125) 1(-5.9,-7.125) 1(-3.4,-7.125) 1(-3.4,7.125) 1(-0.9,7.125) 1(1.6,-7.125) 1(1.6,7.125) 1(4.1,-7.125) 1(6.2,-4.8) 1(6.2,0) 1(6.2,4.8)
Mechanical 13:
  lines w0.102: -42.4,-7.2 6.35,-7.2 6.35,7.2 -42.4,7.2 -42.4,-7.2
Mechanical 15:
  lines w0.102: -38.9,-7.8 -38.9,7.8 ; -1,0 1,0 ; 0,-1 0,1 ; 6.9,-3 5.7,-3 5.7,-6 -8.6,-6 -8.6,3.8 -8.6,6 5.7,6 5.7,3.45 6.9,3.45 ; 6.9,-1.35 5.7,-1.35 5.7,1.75 6.9,1.75 ; -35.4,-8.1 -35.4,-7.2 -35.4,7.2 -35.4,8.1 6.9,8.1 6.9,-8.1 -35.4,-8.1
  text "CNSFP20" at -1,-4.3 h1.3
  text "center for" at -2.7,-6 h1.3
  text "PPL" at -37.2,-1.5 h1.4
  text "PCB" at -33.5,-1.9 h1.4
  text "GND only" at -18.1,-5.1 h1.3
3D body: height 9.25, standoff 0.3, extent -42.4,-7.2 6.35,7.2
3D body: height 9.55, standoff 9.25, extent -42.4,-7.2 6.35,7.2
3D body: height 0.3, standoff 0, extent -42.4,-7.2 6.35,7.2

## SFP-COVERX4 [mm]
pads (50):
  rect 2x2 hole 1.05: MH1(0,0) MH1(0,10) MH1(0,20) MH1(0,30) MH1(5.675,20) MH1(8.575,0) MH1(11.075,20) MH1(14.25,0) MH1(14.25,7.1) MH1(14.25,21.3) MH1(14.25,28.4) MH1(19.925,20) MH1(22.825,0) MH1(25.325,20) MH1(34.175,20) MH1(37.075,0) MH1(39.575,20) MH1(42.75,3.55) MH1(42.75,10.65) MH1(42.75,24.85) MH1(42.75,31.95) MH1(48.425,20) MH1(51.325,0) MH1(53.825,20) MH1(57,5) MH1(57,15) MH1(57,25) MH1(57,35)
  round 1.6 hole 0.95: MH1(0,22.8) MH1(0,27.5) MH1(0,32.5) MH1(2.325,38.375) MH1(7.125,38.375) MH1(11.925,38.375) MH1(16.575,38.375) MH1(21.375,38.375) MH1(26.175,38.375) MH1(30.825,38.375) MH1(35.625,38.375) MH1(40.425,38.375) MH1(45.075,38.375) MH1(49.875,38.375) MH1(54.675,38.375) MH1(57,22.8) MH1(57,27.5) MH1(57,32.5)
  round 2 hole 1.05: MH1(28.5,0) MH1(28.5,7.1) MH1(28.5,21.3) MH1(28.5,28.4)
Mechanical 13:
  lines w0.127: 14.25,-11.5 14.25,38.8 ; 28.5,-11.5 28.5,38.8 ; 42.75,-11.5 42.75,38.8 ; -0.8,-11.5 57.8,-11.5 57.8,38.8 -0.8,38.8 -0.8,-11.5 ; 1,21 1.125,21.125 1.125,37.875 13.125,37.875 13.125,21 1,21 ; 15.25,21 15.375,21.125 15.375,37.875 27.375,37.875 27.375,21 15.25,21 ; 29.625,21 41.625,21 41.625,37.875 29.625,37.875 29.625,21 ; 43.875,21 55.875,21 55.875,37.875 43.875,37.875 43.875,21
Mechanical 15:
  lines w0.102: 3.675,38.8 3.675,37.875 1.125,37.875 1.125,23.575 3.325,23.575 13.125,23.575 13.125,37.875 10.125,37.875 10.125,38.8 ; 5.375,38.8 5.375,37.875 8.475,37.875 8.475,38.8 ; 17.925,38.8 17.925,37.875 15.375,37.875 15.375,23.575 17.575,23.575 27.375,23.575 27.375,37.875 24.375,37.875 24.375,38.8 ; 19.625,38.8 19.625,37.875 22.725,37.875 22.725,38.8 ; 32.175,38.8 32.175,37.875 29.625,37.875 29.625,23.575 31.825,23.575 41.625,23.575 41.625,37.875 38.625,37.875 38.625,38.8 ; 33.875,38.8 33.875,37.875 36.975,37.875 36.975,38.8 ; 46.425,38.8 46.425,37.875 43.875,37.875 43.875,23.575 46.075,23.575 55.875,23.575 55.875,37.875 52.875,37.875 52.875,38.8 ; 48.125,38.8 48.125,37.875 51.225,37.875 51.225,38.8
  lines w0.127: -0.8,-8 57.8,-8 ; 1.825,30.9 2.825,30.9 ; 2.325,30.4 2.325,31.4 ; 11.425,30.9 12.425,30.9 ; 11.925,30.4 11.925,31.4 ; 16.075,30.9 17.075,30.9 ; 16.575,30.4 16.575,31.4 ; 25.675,30.9 26.675,30.9 ; 26.175,30.4 26.175,31.4 ; 30.325,30.9 31.325,30.9 ; 30.825,30.4 30.825,31.4 ; 39.925,30.9 40.925,30.9 ; 40.425,30.4 40.425,31.4 ; 44.575,30.9 45.575,30.9 ; 45.075,30.4 45.075,31.4 ; 54.175,30.9 55.175,30.9 ; 54.675,30.4 54.675,31.4 ; -0.8,-4.5 57.8,-4.5 57.8,38.8 -0.8,38.8 -0.8,-4.5
  text "Front Panel inner edge" at 43.1,-6.3 h1.3
  text "GND only" at 12.1,11.7 h1.3
  text "center for" at 13,27.1 h1.3
  text "CNSFP20" at 11.3,28.8 h1.3
  text "CNSFP20" at 25.55,28.8 h1.3
  text "center for" at 27.25,27.1 h1.3
  text "GND only" at 26.35,11.7 h1.3
  text "CNSFP20" at 39.8,28.8 h1.3
  text "center for" at 41.5,27.1 h1.3
  text "GND only" at 40.6,11.7 h1.3
  text "CNSFP20" at 54.05,28.8 h1.3
  text "center for" at 55.75,27.1 h1.3
  text "GND only" at 54.85,11.7 h1.3
  text "PCB edge" at 33.2,-2.7 h1.3
3D body: height 10.38, standoff -2.03, extent -0.787,-11.5 57.8,38.75

## SMC12MPCBH [mm] "ERNI SMC12 pin MALE HOR"
height 4.2
pads (18):
  rect 1.219x2.54 smd: 0(-5.74,-2.54) 0(-5.74,2.54) 0(5.74,-2.54) 0(5.74,2.54)
  rect 0.8x0.8 smd: A1(-3.175,-2.007) A2(-1.905,-2.007) A3(-0.635,-2.007) A4(0.635,-2.007) A5(1.905,-2.007) A6(3.175,-2.007) B1(-3.175,-3.277) B2(-1.905,-3.277) B3(-0.635,-3.277) B4(0.635,-3.277) B5(1.905,-3.277) B6(3.175,-3.277)
  round 0 hole 1.6 unplated: MH1(-5.385,0) MH2(5.385,0)
Top Overlay:
  circle w0.15: c-4.115,-2.032 r0.152
  lines w0.15: -6.604,3.683 -6.604,-4.064 6.604,-4.064 6.604,3.683
Mechanical 13:
  lines w0.102: -5.175,-1.419 -6.125,-1.419 -6.125,1.381 -5.175,1.381 ; -5.175,3.581 -6.25,3.581 -6.25,-3.619 -5.275,-3.619 -5.275,-2.694 -5.175,-2.594 -5.175,-1.794 ; -3.45,-1.019 -3.45,-3.519 -2.9,-3.519 -2.9,-3.019 -3.3,-3.019 ; -3.3,-3.519 -3.3,-1.019 ; -3.3,-2.244 -2.9,-2.244 -2.9,-1.019 ; -3.3,-1.819 -2.9,-1.819 ; -2.175,-1.019 -2.175,-3.519 -1.625,-3.519 -1.625,-3.019 -2.025,-3.019 ; -2.025,-3.519 -2.025,-1.019 ; -2.025,-2.244 -1.625,-2.244 -1.625,-1.019 ; -2.025,-1.819 -1.625,-1.819 ; -0.9,-1.019 -0.9,-3.519 -0.35,-3.519 -0.35,-3.019 -0.75,-3.019 ; -0.75,-3.519 -0.75,-1.019 ; -0.75,-2.244 -0.35,-2.244 -0.35,-1.019 ; -0.75,-1.819 -0.35,-1.819 ; 0.35,-1.019 0.35,-3.519 0.9,-3.519 0.9,-3.019 0.5,-3.019 ; 0.5,-3.519 0.5,-1.019 ; 0.5,-2.244 0.9,-2.244 0.9,-1.019 ; 0.5,-1.819 0.9,-1.819 ; 1.625,-1.019 1.625,-3.519 2.175,-3.519 2.175,-3.019 1.775,-3.019 ; 1.775,-3.519 1.775,-1.019 ; 1.775,-2.244 2.175,-2.244 2.175,-1.019 ; 1.775,-1.819 2.175,-1.819 ; 2.9,-1.019 2.9,-3.519 3.45,-3.519 3.45,-3.019 3.05,-3.019 ; 3.05,-3.519 3.05,-1.019 ; 3.05,-2.244 3.45,-2.244 3.45,-1.019 ; 3.05,-1.819 3.45,-1.819 ; 5.175,-1.419 6.125,-1.419 6.125,1.381 5.175,1.381 ; 5.175,3.581 6.25,3.581 6.25,-3.619 5.275,-3.619 5.275,-2.694 5.175,-2.594 5.175,-1.794 ; -5.175,-1.794 -4.475,-1.794 -4.475,-1.737 cw(c-3.707,-1.737) -4.25,-1.194 cw(c-3.828,-1.616) -3.828,-1.019 3.696,-1.019 cw(c3.696,-1.873) 4.3,-1.269 cw(c3.878,-1.691) 4.475,-1.691 4.475,-1.794 5.175,-1.794 ; -5.175,-1.794 -5.175,6.381 5.175,6.381 5.175,-1.794 ; -2.65,-0.194 -2.65,0.381 -1.65,0.381 -1.65,-0.194 -2.65,-0.194 ; 1.75,-0.194 1.75,0.381 2.75,0.381 2.75,-0.194 1.75,-0.194
Mechanical 15:
  lines w0.102: -0.635,0 0.635,0 ; 0,-0.635 0,0.635
3D body: height 4.27, standoff -0.68, extent -6.285,-3.625 6.285,6.375

## SMC12MPCBV [mm] "ERNI SMC12 pin MALE VERT"
height 8
pads (18):
  rect 0.8x1.1 smd: A1(3.175,-2.743) A2(1.905,-2.743) A3(0.635,-2.743) A4(-0.635,-2.743) A5(-1.905,-2.743) A6(-3.175,-2.743) B1(3.175,2.743) B2(1.905,2.743) B3(0.635,2.743) B4(-0.635,2.743) B5(-1.905,2.743) B6(-3.175,2.743)
  round 0 hole 1.6 unplated: MH1(-5.385,0) MH2(5.385,0)
  rect 1.2x2.5 smd: MP1(5.842,-2.54) MP2(5.842,2.54) MP3(-5.842,2.54) MP4(-5.842,-2.54)
Top Overlay:
  lines w0.15: -6.604,-3.683 -6.604,3.683 ; 6.604,-3.683 6.604,3.683
  text "A1" at 3.937,-2.794 h0.89
  text "B1" at 3.937,3.81 h0.89
Mechanical 13:
  lines w0.102: -6.335,-1.4 -5.16,-1.4 ; -6.335,1.4 -5.16,1.4 ; -5.16,-0.525 -4.785,-0.525 -4.785,-2.1 ; -5.156,-2.1 5.16,-2.1 ; -5.156,2.083 5.16,2.083 ; -4.485,1.325 -4.485,0.175 -3.985,0.175 ; -4.47,1.325 4.485,1.325 4.485,0.175 3.985,0.175 3.985,-1.35 -3.988,-1.35 ; -3.988,-1.346 -3.988,0.178 ; 4.76,-2.1 4.76,-0.5 5.16,-0.5 ; 5.16,-1.4 6.335,-1.4 ; 5.16,1.4 6.335,1.4 ; 5.16,-2.1 5.16,2.1 5.26,2.2 5.26,2.775 5.335,2.85 5.335,3.6 6.335,3.6 6.335,-3.6 5.335,-3.6 5.335,-2.875 5.26,-2.8 5.26,-2.2 5.16,-2.1 ; -6.335,-3.6 -6.335,3.6 -5.335,3.6 -5.335,2.85 -5.26,2.775 -5.26,2.2 -5.16,2.1 -5.16,-2.1 -5.26,-2.2 -5.26,-2.8 -5.335,-2.875 -5.335,-3.6 -6.335,-3.6 ; -3.415,-0.8 -3.415,-0.5 -2.94,-0.5 -2.94,-0.8 -3.415,-0.8 ; -3.415,0.475 -2.94,0.475 -2.94,0.775 -3.415,0.775 -3.415,0.475 ; -2.145,-0.8 -2.145,-0.5 -1.67,-0.5 -1.67,-0.8 -2.145,-0.8 ; -2.145,0.475 -1.67,0.475 -1.67,0.775 -2.145,0.775 -2.145,0.475 ; -0.875,-0.8 -0.875,-0.5 -0.4,-0.5 -0.4,-0.8 -0.875,-0.8 ; -0.875,0.475 -0.4,0.475 -0.4,0.775 -0.875,0.775 -0.875,0.475 ; 0.395,-0.8 0.395,-0.5 0.87,-0.5 0.87,-0.8 0.395,-0.8 ; 0.395,0.475 0.87,0.475 0.87,0.775 0.395,0.775 0.395,0.475 ; 1.665,-0.8 1.665,-0.5 2.14,-0.5 2.14,-0.8 1.665,-0.8 ; 1.665,0.475 2.14,0.475 2.14,0.775 1.665,0.775 1.665,0.475 ; 2.935,-0.8 3.41,-0.8 3.41,-0.5 2.935,-0.5 2.935,-0.8 ; 2.935,0.475 2.935,0.775 3.41,0.775 3.41,0.475 2.935,0.475
Mechanical 15:
  lines w0.102: -0.635,0 0.635,0 ; 0,-0.635 0,0.635
3D body: height 6.75, standoff -0.75, extent -6.35,-3.6 6.35,3.6

## SMC26MPCBH [mm] "ERNI SMC26 pin MALE HOR"
height 4.2
pads (32):
  rect 0.8x0.8 smd: A1(-7.62,-2.007) A2(-6.35,-2.007) A3(-5.08,-2.007) A4(-3.81,-2.007) A5(-2.54,-2.007) A6(-1.27,-2.007) A7(0,-2.007) A8(1.27,-2.007) A9(2.54,-2.007) A10(3.81,-2.007) A11(5.08,-2.007) A12(6.35,-2.007) A13(7.62,-2.007) B1(-7.62,-3.277) B2(-6.35,-3.277) B3(-5.08,-3.277) B4(-3.81,-3.277) B5(-2.54,-3.277) B6(-1.27,-3.277) B7(0,-3.277) B8(1.27,-3.277) B9(2.54,-3.277) B10(3.81,-3.277) B11(5.08,-3.277) B12(6.35,-3.277) B13(7.62,-3.277)
  round 0 hole 1.6 unplated: MH1(-9.83,0) MH2(9.83,0)
  rect 1.219x2.54 smd: MP1(-10.185,-2.54) MP2(-10.185,2.54) MP3(10.255,-2.54) MP4(10.255,2.54)
Top Overlay:
  circle w0.15: c-8.56,-2.032 r0.152
  lines w0.15: -11.049,3.683 -11.049,-4.064 11.119,-4.064 11.119,3.683
Mechanical 13:
  lines w0.102: -9.62,-1.419 -10.57,-1.419 -10.57,1.381 -9.62,1.381 ; -9.62,3.581 -10.695,3.581 -10.695,-3.619 -9.72,-3.619 -9.72,-2.694 -9.62,-2.594 -9.62,-1.794 ; -7.895,-1.019 -7.895,-3.519 -7.345,-3.519 -7.345,-3.019 -7.745,-3.019 ; -7.745,-3.519 -7.745,-1.019 ; -7.745,-2.244 -7.345,-2.244 -7.345,-1.019 ; -7.745,-1.819 -7.345,-1.819 ; -6.62,-1.019 -6.62,-3.519 -6.07,-3.519 -6.07,-3.019 -6.47,-3.019 ; -6.47,-3.519 -6.47,-1.019 ; -6.47,-2.244 -6.07,-2.244 -6.07,-1.019 ; -6.47,-1.819 -6.07,-1.819 ; -5.345,-1.019 -5.345,-3.519 -4.795,-3.519 -4.795,-3.019 -5.195,-3.019 ; -5.195,-3.519 -5.195,-1.019 ; -5.195,-2.244 -4.795,-2.244 -4.795,-1.019 ; -5.195,-1.819 -4.795,-1.819 ; -4.095,-1.019 -4.095,-3.519 -3.545,-3.519 -3.545,-3.019 -3.945,-3.019 ; -3.945,-3.519 -3.945,-1.019 ; -3.945,-2.244 -3.545,-2.244 -3.545,-1.019 ; -3.945,-1.819 -3.545,-1.819 ; -2.82,-1.019 -2.82,-3.519 -2.27,-3.519 -2.27,-3.019 -2.67,-3.019 ; -2.67,-3.519 -2.67,-1.019 ; -2.67,-2.244 -2.27,-2.244 -2.27,-1.019 ; -2.67,-1.819 -2.27,-1.819 ; -1.545,-1.019 -1.545,-3.519 -0.995,-3.519 -0.995,-3.019 -1.395,-3.019 ; -1.395,-3.519 -1.395,-1.019 ; -1.395,-2.244 -0.995,-2.244 -0.995,-1.019 ; -1.395,-1.819 -0.995,-1.819 ; -0.275,-1.019 -0.275,-3.519 0.275,-3.519 0.275,-3.019 -0.125,-3.019 ; -0.125,-3.519 -0.125,-1.019 ; -0.125,-2.244 0.275,-2.244 0.275,-1.019 ; -0.125,-1.819 0.275,-1.819 ; 1,-1.019 1,-3.519 1.55,-3.519 1.55,-3.019 1.15,-3.019 ; 1.15,-3.519 1.15,-1.019 ; 1.15,-2.244 1.55,-2.244 1.55,-1.019 ; 1.15,-1.819 1.55,-1.819 ; 2.275,-1.019 2.275,-3.519 2.825,-3.519 2.825,-3.019 2.425,-3.019 ; 2.425,-3.519 2.425,-1.019 ; 2.425,-2.244 2.825,-2.244 2.825,-1.019 ; 2.425,-1.819 2.825,-1.819 ; 3.525,-1.019 3.525,-3.519 4.075,-3.519 4.075,-3.019 3.675,-3.019 ; 3.675,-3.519 3.675,-1.019 ; 3.675,-2.244 4.075,-2.244 4.075,-1.019 ; 3.675,-1.819 4.075,-1.819 ; 4.8,-1.019 4.8,-3.519 5.35,-3.519 5.35,-3.019 4.95,-3.019 ; 4.95,-3.519 4.95,-1.019 ; 4.95,-2.244 5.35,-2.244 5.35,-1.019 ; 4.95,-1.819 5.35,-1.819 ; 6.075,-1.019 6.075,-3.519 6.625,-3.519 6.625,-3.019 6.225,-3.019 ; 6.225,-3.519 6.225,-1.019 ; 6.225,-2.244 6.625,-2.244 6.625,-1.019 ; 6.225,-1.819 6.625,-1.819 ; 7.345,-1.019 7.345,-3.519 7.895,-3.519 7.895,-3.019 7.495,-3.019 ; 7.495,-3.519 7.495,-1.019 ; 7.495,-2.244 7.895,-2.244 7.895,-1.019 ; 7.495,-1.819 7.895,-1.819 ; 9.69,-1.419 10.64,-1.419 10.64,1.381 9.69,1.381 ; 9.69,3.581 10.765,3.581 10.765,-3.619 9.79,-3.619 9.79,-2.694 9.69,-2.594 9.69,-1.794 ; -9.62,-1.794 -8.92,-1.794 -8.92,-1.737 cw(c-8.152,-1.737) -8.695,-1.194 cw(c-8.273,-1.616) -8.273,-1.019 8.211,-1.019 cw(c8.211,-1.873) 8.815,-1.269 cw(c8.393,-1.691) 8.99,-1.691 8.99,-1.794 9.69,-1.794 ; -9.62,-1.794 -9.62,6.381 9.69,6.381 9.69,-1.794 ; -7.095,-0.194 -7.095,0.381 -6.095,0.381 -6.095,-0.194 -7.095,-0.194 ; 6.265,-0.194 7.265,-0.194 7.265,0.381 6.265,0.381 6.265,-0.194
Mechanical 15:
  lines w0.102: -0.635,0 0.635,0 ; 0,-0.635 0,0.635
3D body: height 4.27, standoff -0.68, extent -10.73,-3.599 10.73,6.401